# Altium footprint library SoM_Artix.PcbLib: 239 footprints (part 14 of 15)
Each footprint in its own frame and in the unit in brackets; x right, y up, seen from the top. Pads: shape width x height; smd on the part's side, far side on the other; paste and mask are expansions set on the pad; w line width, h text height; cw(c..) or ccw(c..) is an arc to the next point about the centre after c.
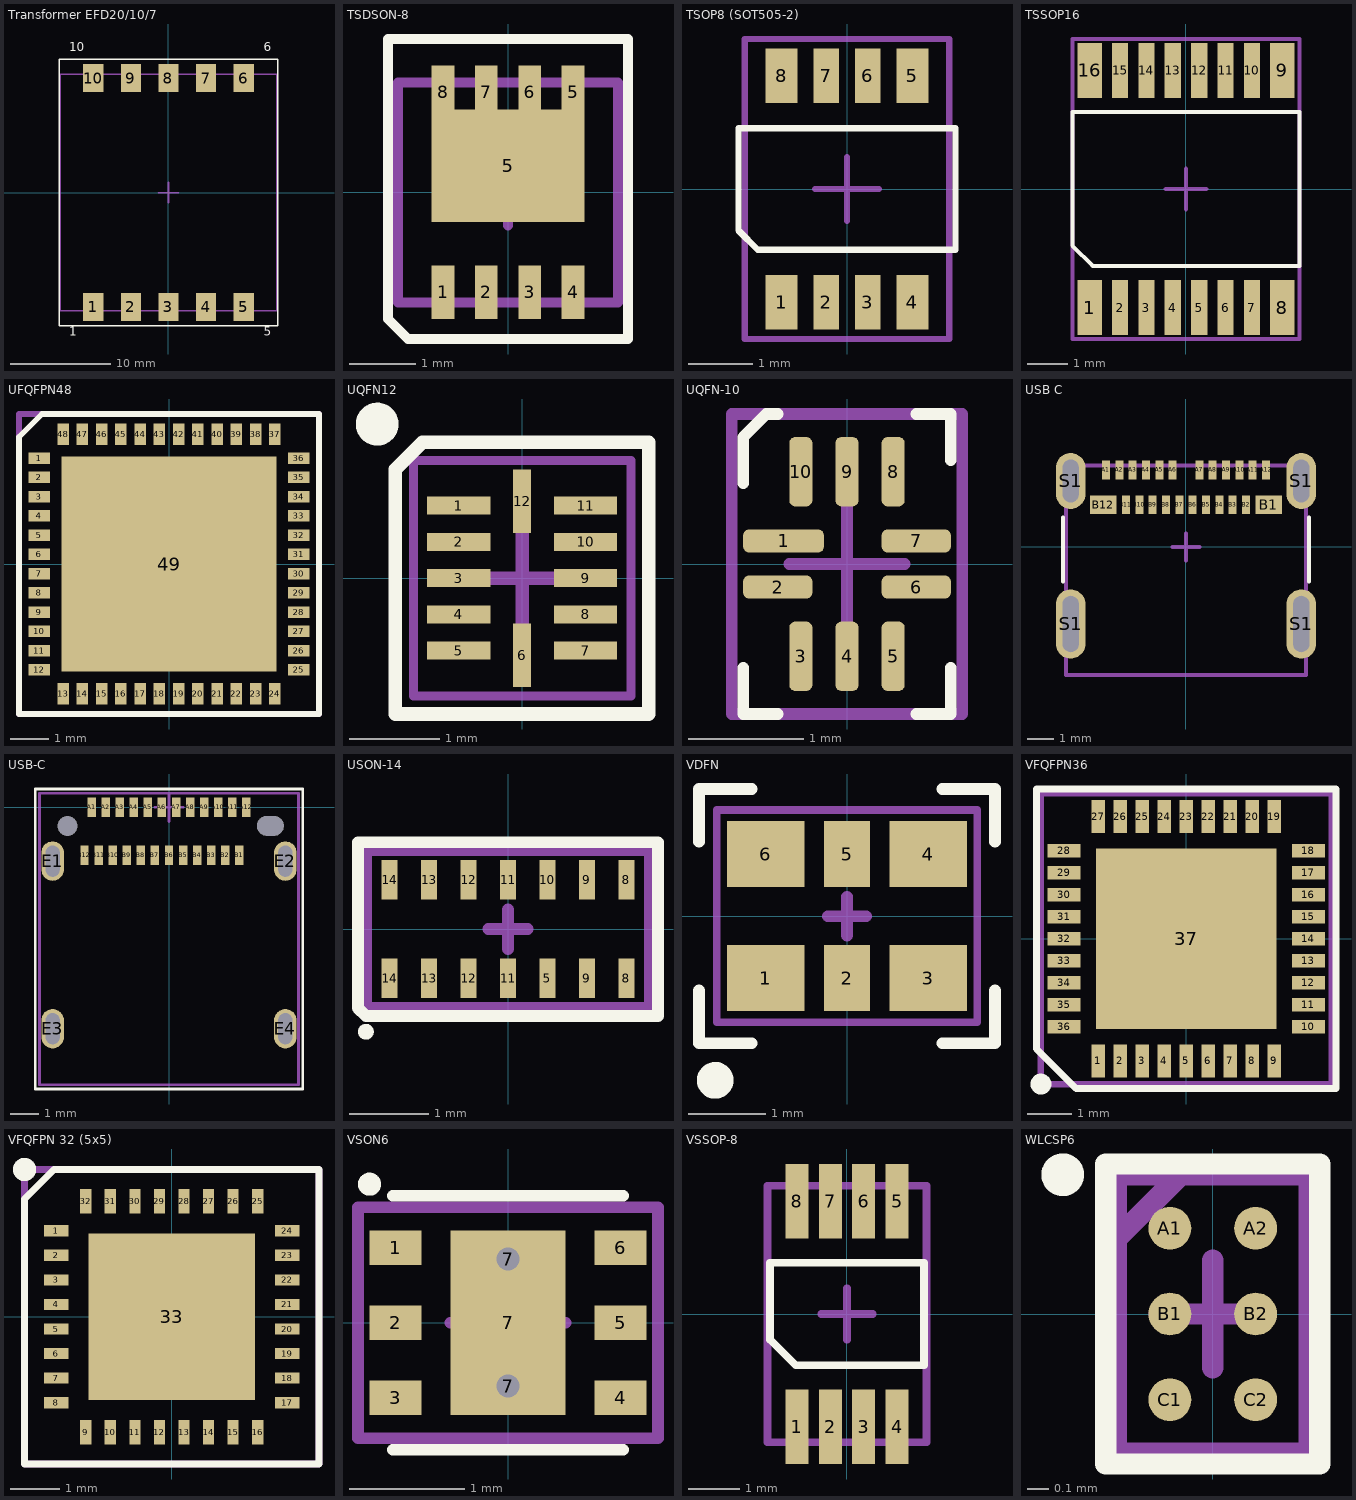
[diagram p13: the footprints below, top view; thin cyan lines are the x and y axes]

## Transformer EFD20/10/7 [mm] "CPHS-EFD20/7-1S-10P"
pads (10):
  rect 2x2.8 smd: 1(-7.5,-11.4) 2(-3.75,-11.4) 3(0,-11.4) 4(3.75,-11.4) 5(7.5,-11.4) 6(7.5,11.4) 7(3.75,11.4) 8(0,11.4) 9(-3.75,11.4) 10(-7.5,11.4)
Top Overlay:
  lines w0.15: -10.9,-13.3 -10.9,13.3 10.9,13.3 10.9,-13.3 -10.9,-13.3
  text "1" at -9.9,-14.6 h1.5
  text "5" at 9.5,-14.593 h1.5
  text "6" at 9.5,13.8 h1.5
  text "10" at -9.9,13.8 h1.5
Mechanical 13:
  lines w0.15: -1,0 1,0 ; 0,-1 0,1 ; -10.8,-11.8 -10.8,11.8 10.8,11.8 10.8,-11.8 -10.8,-11.8
3D body "User Library-TDK_EFD20.step": height 10.7, standoff 0, extent -11,-12.85 11,12.85

## TSDSON-8 [mm]
pads (9):
  rect 0.34x0.8 smd: 1(-0.975,-1.5) 2(-0.325,-1.5) 3(0.325,-1.5) 4(0.975,-1.5) 5(0.975,1.5) 6(0.325,1.5) 7(-0.325,1.5) 8(-0.975,1.5)
  rect 2.29x1.69 smd: 5(0,0.4)
Top Overlay:
  lines w0.15: -1.8,-1.9 -1.5,-2.2 1.8,-2.2 1.8,2.3 -1.8,2.3 -1.8,-1.9
Mechanical 13:
  lines w0.15: -0.5,0 0.5,0 ; 0,-0.5 0,0.5 ; -1.65,-1.65 -1.65,1.65 1.65,1.65 1.65,-1.65 -1.65,-1.65
3D body "User Library-PG-TSDSON-8-1.STEP": height -0.4, standoff -1.51, extent -1.7,-1.7 1.7,1.7

## TSOP8 (SOT505-2) [mm]
pads (8):
  rect 0.5x0.85 smd mask+0.05: 1(-1.025,-1.775) 4(1.025,-1.775) 5(1.025,1.775) 8(-1.025,1.775)
  rect 0.4x0.85 smd mask+0.05: 2(-0.325,-1.775) 3(0.325,-1.775) 6(0.325,1.775) 7(-0.325,1.775)
Top Overlay:
  lines w0.1: -1.7,-0.65 -1.4,-0.95 1.7,-0.95 1.7,0.95 -1.7,0.95 -1.7,-0.65
Mechanical 15:
  lines w0.1: -0.5,0 0.5,0 ; 0,-0.5 0,0.5 ; -1.6,-2.35 -1.6,2.35 1.6,2.35 1.6,-2.35 -1.6,-2.35
3D body "User Library-TSSOP8-1.step": height 1.1, standoff 0, extent -1.55,-2.05 1.55,2.05

## TSSOP16 [mm]
pads (16):
  rect 0.6x1.35 smd mask+0.05: 1(-2.375,-2.925) 8(2.375,-2.925) 9(2.375,2.925) 16(-2.375,2.925)
  rect 0.4x1.35 smd mask+0.05: 2(-1.625,-2.925) 3(-0.975,-2.925) 4(-0.325,-2.925) 5(0.325,-2.925) 6(0.975,-2.925) 7(1.625,-2.925) 10(1.625,2.925) 11(0.975,2.925) 12(0.325,2.925) 13(-0.325,2.925) 14(-0.975,2.925) 15(-1.625,2.925)
Top Overlay:
  lines w0.1: -2.8,-1.4 -2.3,-1.9 2.8,-1.9 2.8,1.9 -2.8,1.9 -2.8,-1.4
Mechanical 15:
  lines w0.1: -0.5,0 0.5,0 ; 0,-0.5 0,0.5 ; -2.8,-3.7 2.8,-3.7 2.8,3.7 -2.8,3.7 -2.8,-3.7
3D body "User Library-TSSOP-16-2.STEP": height 1.2, standoff 0, extent -2.5,-3.2 2.5,3.2

## UFQFPN48 [mm]
pads (49):
  rect 0.55x0.3 smd mask+0.07: 1(-3.375,2.75) 2(-3.375,2.25) 3(-3.375,1.75) 4(-3.375,1.25) 5(-3.375,0.75) 6(-3.375,0.25) 7(-3.375,-0.25) 8(-3.375,-0.75) 9(-3.375,-1.25) 10(-3.375,-1.75) 11(-3.375,-2.25) 12(-3.375,-2.75) 25(3.375,-2.75) 26(3.375,-2.25) 27(3.375,-1.75) 28(3.375,-1.25) 29(3.375,-0.75) 30(3.375,-0.25) 31(3.375,0.25) 32(3.375,0.75) 33(3.375,1.25) 34(3.375,1.75) 35(3.375,2.25) 36(3.375,2.75)
  rect 0.3x0.55 smd mask+0.07: 13(-2.75,-3.375) 14(-2.25,-3.375) 15(-1.75,-3.375) 16(-1.25,-3.375) 17(-0.75,-3.375) 18(-0.25,-3.375) 19(0.25,-3.375) 20(0.75,-3.375) 21(1.25,-3.375) 22(1.75,-3.375) 23(2.25,-3.375) 24(2.75,-3.375) 37(2.75,3.375) 38(2.25,3.375) 39(1.75,3.375) 40(1.25,3.375) 41(0.75,3.375) 42(0.25,3.375) 43(-0.25,3.375) 44(-0.75,3.375) 45(-1.25,3.375) 46(-1.75,3.375) 47(-2.25,3.375) 48(-2.75,3.375)
  rect 5.6x5.6 smd mask+0.07: 49(0,0)
Top Overlay:
  lines w0.15: -3.9,-3.9 -3.9,3.3 -3.3,3.9 3.9,3.9 3.9,-3.9 -3.9,-3.9
Mechanical 15:
  lines w0.15: -0.5,0 0.5,0 ; 0,-0.5 0,0.5 ; -3.9,-3.9 3.9,-3.9 3.9,3.9 -3.9,3.9 -3.9,-3.9
3D body "User Library-UFQFPN48.step": height 0.55, standoff 0, extent -3.5,-3.5 3.5,3.5

## UQFN12 [mm]
pads (12):
  rect 0.7x0.2 smd: 1(-0.7,0.8) 2(-0.7,0.4) 3(-0.7,0) 4(-0.7,-0.4) 5(-0.7,-0.8) 7(0.7,-0.8) 8(0.7,-0.4) 9(0.7,0) 10(0.7,0.4) 11(0.7,0.8)
  rect 0.2x0.7 smd: 6(0,-0.85) 12(0,0.85)
Top Overlay:
  circle w0.25: c-1.6,1.7 r0.112
  lines w0.15: -1.4,-1.5 1.4,-1.5 1.4,1.5 -1.1,1.5 -1.4,1.2 -1.4,-1.5
Mechanical 13:
  lines w0.1: -1.2,-1.3 -1.2,1.3 1.2,1.3 1.2,-1.3 -1.2,-1.3
  lines w0.15: -0.5,0 0.5,0 ; 0,-0.5 0,0.5
3D body "TXB0104RUTR--3DModel-STEP-56544.STEP": height 0.55, standoff 0, extent -0.85,-1 0.85,1

## UQFN-10 [mm]
pads (10):
  rrect50% 0.7x0.2 smd mask+0.05: 1(-0.55,0.2)
  rrect50% 0.6x0.2 smd mask+0.05: 2(-0.6,-0.2) 6(0.6,-0.2) 7(0.6,0.2)
  rrect50% 0.2x0.6 smd mask+0.05: 3(-0.4,-0.8) 4(0,-0.8) 5(0.4,-0.8) 8(0.4,0.8) 9(0,0.8) 10(-0.4,0.8)
Top Overlay:
  lines w0.1: -0.9,-0.9 -0.9,-1.3 -0.6,-1.3 ; -0.9,0.7 -0.9,1.1 -0.7,1.3 -0.6,1.3 ; 0.6,-1.3 0.9,-1.3 0.9,-0.9 ; 0.6,1.3 0.9,1.3 0.9,0.9
Mechanical 15:
  lines w0.1: -0.5,0 0.5,0 ; 0,-0.5 0,0.5 ; -1,-1.3 -1,1.3 1,1.3 1,-1.3 -1,-1.3
3D body "User Library-UQFN10 1_4x1_8mm 0_4 pitch with black mark.step": height 0.5, standoff 0, extent -0.7,-0.9 0.7,0.9

## USB C [mm] "1054500101"
pads (28):
  rect 0.3x0.7 smd mask+0.08: A1(-3,2.885) A2(-2.5,2.885) A3(-2,2.885) A4(-1.5,2.885) A5(-1,2.885) A6(-0.5,2.885) A7(0.5,2.885) A8(1,2.885) A9(1.5,2.885) A10(2,2.885) A11(2.5,2.885) A12(3,2.885) B2(2.25,1.585) B3(1.75,1.585) B4(1.25,1.585) B5(0.75,1.585) B6(0.25,1.585) B7(-0.25,1.585) B8(-0.75,1.585) B9(-1.25,1.585) B10(-1.75,1.585) B11(-2.25,1.585)
  rect 1x0.7 smd mask+0.08: B1(3.1,1.585) B12(-3.1,1.585)
  oval 1.1x2.6 hole 0.6 slot 2.1 at 90 deg mask+0.08: S1(-4.32,-2.885) S1(4.32,-2.885)
  oval 1.1x2.1 hole 0.6 slot 1.6 at 90 deg mask+0.08: S1(-4.32,2.475) S1(4.32,2.475)
Top Overlay:
  lines w0.15: -4.6,-1.3 -4.6,1.1 ; 4.6,-1.3 4.6,1.1
Mechanical 15:
  lines w0.15: -0.5,0 0.5,0 ; 0,-0.5 0,0.5 ; -4.5,-4.8 4.5,-4.8 4.5,3.06 -4.5,3.06 -4.5,-4.8
3D body "1054500101.stp": height 3.18, standoff -0.78, extent -4.47,-4.7 4.47,3.2

## USB-C [mm]
pads (30):
  rect 0.3x0.7 smd: A1(-2.75,0) A2(-2.25,0) A3(-1.75,0) A4(-1.25,0) A5(-0.75,0) A6(-0.25,0) A7(0.25,0) A8(0.75,0) A9(1.25,0) A10(1.75,0) A11(2.25,0) A12(2.75,0) B1(2.5,-1.7) B2(2,-1.7) B3(1.5,-1.7) B4(1,-1.7) B5(0.5,-1.7) B6(0,-1.7) B7(-0.5,-1.7) B8(-1,-1.7) B9(-1.5,-1.7) B10(-2,-1.7) B11(-2.5,-1.7) B12(-3,-1.7)
  oval 0.8x1.4 hole 0.5 slot 1.1 at 90 deg: E1(-4.13,-1.91) E2(4.13,-1.91) E3(-4.13,-7.86) E4(4.13,-7.86)
  round 0 hole 0.7 unplated: H1(-3.6,-0.66)
  round 0 hole 0.7 slot 0.95 at 0 deg unplated: H2(3.6,-0.66)
Top Overlay:
  lines w0.1: -4.75,-10 4.75,-10 4.75,0.65 -4.75,0.65 -4.75,-10
Mechanical 15:
  lines w0.1: -0.5,0 0.5,0 ; 0,-0.5 0,0.5 ; -4.6,-9.85 -4.6,0.5 4.6,0.5 4.6,-9.85 -4.6,-9.85

## USON-14 [mm]
pads (14):
  rect 0.2x0.5 smd mask+0.07: 5(0.5,-0.625) 8(1.5,-0.625) 8(1.5,0.625) 9(1,-0.625) 9(1,0.625) 10(0.5,0.625) 11(0,-0.625) 11(0,0.625) 12(-0.5,-0.625) 12(-0.5,0.625) 13(-1,-0.625) 13(-1,0.625) 14(-1.5,-0.625) 14(-1.5,0.625)
Top Overlay:
  circle w0.1: c-1.8,-1.3 r0.05
  lines w0.15: -1.9,-1 -1.8,-1.1 1.9,-1.1 1.9,1.1 -1.9,1.1 -1.9,-1
Mechanical 15:
  lines w0.15: -0.25,0 0.25,0 ; 0,-0.25 0,0.25 ; -1.8,-1 -1.8,1 1.8,1 1.8,-1 -1.8,-1
3D body "User Library-USON-14_RVZ14.step": height 0.55, standoff 0, extent -1.75,-0.685 1.75,0.685

## VDFN [mm]
height 0.9
pads (6):
  rect 1x0.85 smd: 1(-1.05,-0.8) 3(1.05,-0.8) 4(1.05,0.8) 6(-1.05,0.8)
  rect 0.6x0.85 smd: 2(0,-0.8) 5(0,0.8)
Top Overlay:
  circle w0.25: c-1.7,-2.12 r0.112
  lines w0.15: -1.91,-0.96 -1.91,-1.64 -1.23,-1.64 ; -1.91,0.96 -1.91,1.64 -1.23,1.64 ; 1.23,-1.64 1.91,-1.64 1.91,-0.96 ; 1.23,1.64 1.91,1.64 1.91,0.96
Mechanical 15:
  lines w0.1: -1.68,-1.37 -1.68,1.37 1.68,1.37 1.68,-1.37 -1.68,-1.37
  lines w0.15: -0.25,0 0.25,0 ; 0,-0.25 0,0.25
3D body "User Library-DFN-6 3_2x2_5.STEP": height 0.82, standoff -0.03, extent -1.593,-1.245 1.607,1.255

## VFQFPN36 [mm]
pads (37):
  rect 0.3x0.75 smd mask+0.08: 1(-2,-2.775) 2(-1.5,-2.775) 3(-1,-2.775) 4(-0.5,-2.775) 5(0,-2.775) 6(0.5,-2.775) 7(1,-2.775) 8(1.5,-2.775) 9(2,-2.775) 19(2,2.775) 20(1.5,2.775) 21(1,2.775) 22(0.5,2.775) 23(0,2.775) 24(-0.5,2.775) 25(-1,2.775) 26(-1.5,2.775) 27(-2,2.775)
  rect 0.75x0.3 smd mask+0.08: 10(2.775,-2) 11(2.775,-1.5) 12(2.775,-1) 13(2.775,-0.5) 14(2.775,0) 15(2.775,0.5) 16(2.775,1) 17(2.775,1.5) 18(2.775,2) 28(-2.775,2) 29(-2.775,1.5) 30(-2.775,1) 31(-2.775,0.5) 32(-2.775,0) 33(-2.775,-0.5) 34(-2.775,-1) 35(-2.775,-1.5) 36(-2.775,-2)
  rect 4.1x4.1 smd: 37(0,0)
Top Overlay:
  circle w0.25: c-3.3,-3.3 r0.112
  lines w0.15: -3.4,-2.5 -3.4,3.4 3.4,3.4 3.4,-3.4 -2.5,-3.4 -3.4,-2.5
Mechanical 15:
  lines w0.1: -0.25,0 0.25,0 ; 0,-0.25 0,0.25
  lines w0.15: -3.3,-3.3 -3.3,3.3 3.3,3.3 3.3,-3.3 -3.3,-3.3
3D body "ALSRobot-QFN36 6x6.step": height 0.9, standoff 0.01, extent -3.103,-3.103 3.103,3.103

## VFQFPN 32 (5x5) [mm]
pads (33):
  rect 0.5x0.23 smd mask+0.05: 1(-2.35,1.75) 2(-2.35,1.25) 3(-2.35,0.75) 4(-2.35,0.25) 5(-2.35,-0.25) 6(-2.35,-0.75) 7(-2.35,-1.25) 8(-2.35,-1.75) 17(2.35,-1.75) 18(2.35,-1.25) 19(2.35,-0.75) 20(2.35,-0.25) 21(2.35,0.25) 22(2.35,0.75) 23(2.35,1.25) 24(2.35,1.75)
  rect 0.23x0.5 smd mask+0.05: 9(-1.75,-2.35) 10(-1.25,-2.35) 11(-0.75,-2.35) 12(-0.25,-2.35) 13(0.25,-2.35) 14(0.75,-2.35) 15(1.25,-2.35) 16(1.75,-2.35) 25(1.75,2.35) 26(1.25,2.35) 27(0.75,2.35) 28(0.25,2.35) 29(-0.25,2.35) 30(-0.75,2.35) 31(-1.25,2.35) 32(-1.75,2.35)
  rect 3.4x3.4 smd mask+0.05: 33(0,0)
Top Overlay:
  circle w0.25: c-3,3 r0.112
  lines w0.15: -3,-3 -3,2.4 -2.4,3 3,3 3,-3 -3,-3
Mechanical 15:
  lines w0.1: -0.25,0 0.25,0 ; 0,-0.25 0,0.25
  lines w0.15: -3,-3 -3,3 3,3 3,-3 -3,-3
3D body "VFQFPN-32_5x5x1mm_STM.step": height 0.99, standoff 0, extent -2.578,-2.578 2.578,2.578

## VSON6 [mm]
pads (9):
  rect 0.45x0.3 smd mask+0.05: 1(-0.975,0.65) 2(-0.975,0) 3(-0.975,-0.65) 4(0.975,-0.65) 5(0.975,0) 6(0.975,0.65)
  round 0.4 hole 0.2 unplated mask+0.05: 7(0,-0.55) 7(0,0.55)
  rect 1x1.6 smd mask+0.05: 7(0,0)
Top Overlay:
  circle w0.1: c-1.2,1.2 r0.05
  lines w0.1: -1,-1.1 1,-1.1 ; -1,1.1 1,1.1
Mechanical 15:
  lines w0.1: -0.5,0 0.5,0 ; 0,-0.5 0,0.5 ; -1.3,-1 -1.3,1 1.3,1 1.3,-1 -1.3,-1
3D body "User Library-QFN6.step": height 0.75, standoff 0, extent -1.001,-1 1.001,1

## VSSOP-8 [mm]
pads (8):
  rect 0.45x1.45 smd: 1(-0.975,-2.2) 2(-0.325,-2.2) 3(0.325,-2.2) 4(0.975,-2.2) 5(0.975,2.2) 6(0.325,2.2) 7(-0.325,2.2) 8(-0.975,2.2)
Top Overlay:
  lines w0.15: -1.5,-0.5 -1,-1 1.5,-1 1.5,1 -1.5,1 -1.5,-0.5
Mechanical 13:
  lines w0.15: -0.5,0 0.5,0 ; 0,-0.5 0,0.5 ; -1.55,-2.5 -1.55,2.5 1.55,2.5 1.55,-2.5 -1.55,-2.5
3D body "User Library-VSSOP8 3x3 e0_65-1.step": height 1.1, standoff 0, extent -1.5,-2.5 1.5,2.5

## WLCSP6 [mm] "1.20x0.80"
height 0.33
pads (6):
  round 0.2 smd: A1(-0.2,0.4) A2(0.2,0.4) B1(-0.2,0) B2(0.2,0) C1(-0.2,-0.4) C2(0.2,-0.4)
Top Overlay:
  circle w0.1: c-0.7,0.65 r0.05
  lines w0.1: -0.5,-0.7 0.5,-0.7 0.5,0.7 -0.5,0.7 -0.5,-0.7
Mechanical 15:
  lines w0.1: -0.45,0.35 -0.15,0.65 ; -0.25,0 0.25,0 ; 0,-0.25 0,0.25 ; -0.45,-0.65 -0.45,0.65 0.45,0.65 0.45,-0.65 -0.45,-0.65
3D body "User Library-User Library-WLCSP-6.step": height 0.62, standoff -0.01, extent -0.44,-0.613 0.44,0.613